# Altium footprint library Connectors THD.PcbLib: 631 footprints (part 6 of 46) (continued)
## 3M_N3627-6202RB [mm] "3M, 3000 Series, 24 Contacts - Pitch 2.54mm - Straight Four-Wall Header (Black) With Short Roll Pin Latch/Ejectors"
height 24.6
pads (26):
  round 1.6 hole 0.9: 1(-13.97,-1.27) 2(-13.97,1.27) 3(-11.43,-1.27) 4(-11.43,1.27) 5(-8.89,-1.27) 6(-8.89,1.27) 7(-6.35,-1.27) 8(-6.35,1.27) 9(-3.81,-1.27) 10(-3.81,1.27) 11(-1.27,-1.27) 12(-1.27,1.27) 13(1.27,-1.27) 14(1.27,1.27) 15(3.81,-1.27) 16(3.81,1.27) 17(6.35,-1.27) 18(6.35,1.27) 19(8.89,-1.27) 20(8.89,1.27) 21(11.43,-1.27) 22(11.43,1.27) 23(13.97,-1.27) 24(13.97,1.27)
  round 4.6 hole 2.8: MTG1(-22.924,-0.254) MTG2(22.924,-0.254)
Top Overlay:
  lines w0.2: -24.892,-2 -24.892,-4.318 ; -24.892,1.7 -24.892,4.3 ; -2.032,-4.318 -2.032,-3.175 ; 2.032,-4.318 2.032,-3.175 ; 14.732,-4.318 -24.892,-4.318 ; 14.732,4.318 -24.892,4.318 24.892,4.318 ; 24.892,-2 24.892,-4.318 -24.892,-4.318 ; 24.892,1.7 24.892,4.3 ; -17.907,-3.175 17.907,-3.175 17.907,3.175 -17.907,3.175 -17.907,-3.175 ; -15.24,-3.175 -12.7,-3.175 -13.97,-4.318 -15.24,-3.175
  text "1" at -16.307,-2.921 h1.02
  text "24" at 15.205,1.727 h1.02
Mechanical 8:
  lines w0.1: -14.97,-1.27 -13.97,-1.27 ; -14.97,1.27 -13.97,1.27 ; -13.97,-2.27 -13.97,-1.27 ; -13.97,-0.27 -13.97,-1.27 ; -13.97,0.27 -13.97,1.27 ; -13.97,2.27 -13.97,1.27 ; -12.97,-1.27 -13.97,-1.27 ; -12.97,1.27 -13.97,1.27 ; -12.43,-1.27 -11.43,-1.27 ; -12.43,1.27 -11.43,1.27 ; -11.43,-2.27 -11.43,-1.27 ; -11.43,-0.27 -11.43,-1.27 ; -11.43,0.27 -11.43,1.27 ; -11.43,2.27 -11.43,1.27 ; -10.43,-1.27 -11.43,-1.27 ; -10.43,1.27 -11.43,1.27 ; -9.89,-1.27 -8.89,-1.27 ; -9.89,1.27 -8.89,1.27 ; -8.89,-2.27 -8.89,-1.27 ; -8.89,-0.27 -8.89,-1.27 ; -8.89,0.27 -8.89,1.27 ; -8.89,2.27 -8.89,1.27 ; -7.89,-1.27 -8.89,-1.27 ; -7.89,1.27 -8.89,1.27 ; -7.35,-1.27 -6.35,-1.27 ; -7.35,1.27 -6.35,1.27 ; -6.35,-2.27 -6.35,-1.27 ; -6.35,-0.27 -6.35,-1.27 ; -6.35,0.27 -6.35,1.27 ; -6.35,2.27 -6.35,1.27 ; -5.35,-1.27 -6.35,-1.27 ; -5.35,1.27 -6.35,1.27 ; -4.81,-1.27 -3.81,-1.27 ; -4.81,1.27 -3.81,1.27 ; -3.81,-2.27 -3.81,-1.27 ; -3.81,-0.27 -3.81,-1.27 ; -3.81,0.27 -3.81,1.27 ; -3.81,2.27 -3.81,1.27 ; -2.81,-1.27 -3.81,-1.27 ; -2.81,1.27 -3.81,1.27 ; -2.27,-1.27 -1.27,-1.27 ; -2.27,1.27 -1.27,1.27 ; -1.27,-2.27 -1.27,-1.27 ; -1.27,-0.27 -1.27,-1.27 ; -1.27,0.27 -1.27,1.27 ; -1.27,2.27 -1.27,1.27 ; -1,0 0,0 ; -0.27,-1.27 -1.27,-1.27 ; -0.27,1.27 -1.27,1.27 ; 0,-1 0,0 ; 0,1 0,0 ; 0.27,-1.27 1.27,-1.27 ; 0.27,1.27 1.27,1.27 ; 1,0 0,0 ; 1.27,-2.27 1.27,-1.27 ; 1.27,-0.27 1.27,-1.27 ; 1.27,0.27 1.27,1.27 ; 1.27,2.27 1.27,1.27 ; 2.27,-1.27 1.27,-1.27 ; 2.27,1.27 1.27,1.27 ; 2.81,-1.27 3.81,-1.27 ; 2.81,1.27 3.81,1.27 ; 3.81,-2.27 3.81,-1.27 ; 3.81,-0.27 3.81,-1.27 ; 3.81,0.27 3.81,1.27 ; 3.81,2.27 3.81,1.27 ; 4.81,-1.27 3.81,-1.27 ; 4.81,1.27 3.81,1.27 ; 5.35,-1.27 6.35,-1.27 ; 5.35,1.27 6.35,1.27 ; 6.35,-2.27 6.35,-1.27 ; 6.35,-0.27 6.35,-1.27 ; 6.35,0.27 6.35,1.27 ; 6.35,2.27 6.35,1.27 ; 7.35,-1.27 6.35,-1.27 ; 7.35,1.27 6.35,1.27 ; 7.89,-1.27 8.89,-1.27 ; 7.89,1.265 8.89,1.265 ; 8.89,-2.27 8.89,-1.27 ; 8.89,-0.27 8.89,-1.27 ; 8.89,0.27 8.89,1.27 ; 8.89,2.27 8.89,1.27 ; 9.89,-1.27 8.89,-1.27 ; 9.89,1.27 8.89,1.27 ; 10.43,-1.27 11.43,-1.27 ; 10.43,1.27 11.43,1.27 ; 11.43,-2.27 11.43,-1.27 ; 11.43,-0.27 11.43,-1.27 ; 11.43,0.27 11.43,1.27 ; 11.43,2.27 11.43,1.27 ; 12.43,-1.27 11.43,-1.27 ; 12.43,1.27 11.43,1.27 ; 12.97,-1.27 13.97,-1.27 ; 12.97,1.265 13.97,1.265 ; 13.97,-2.27 13.97,-1.27 ; 13.97,-0.27 13.97,-1.27 ; 13.97,0.27 13.97,1.27 ; 13.97,2.27 13.97,1.27 ; 14.97,-1.27 13.97,-1.27 ; 14.97,1.27 13.97,1.27
Mechanical 14:
  circle w0.1: c22.924,-0.254 r1.27
  circle w0.1: c-22.924,-0.254 r1.27
  lines w0.1: -24.892,-3.175 -21.564,-3.175 ; -23.924,-0.254 -22.924,-0.254 ; -22.924,-1.254 -22.924,-0.254 ; -22.924,0.746 -22.924,-0.254 ; -21.924,-0.254 -22.924,-0.254 ; -21.564,-4.318 -21.564,-1.727 -14.605,-1.727 -14.605,1.27 -21.564,1.27 -21.564,4.318 ; -20.722,-4.318 -20.722,-1.727 ; -20.722,1.27 -20.722,4.318 ; -18.289,-4.318 -18.288,-1.727 ; -17.907,-1.727 -17.907,-3.175 17.907,-3.175 17.907,-1.727 ; -17.907,1.27 -17.907,3.175 17.907,3.175 17.907,1.27 ; -11.119,-4.318 -11.119,-3.175 ; -9.201,-4.318 -9.201,-3.175 ; 17.446,-4.318 17.446,-3.175 ; 17.446,3.175 17.446,4.318 ; 18.288,1.27 18.288,4.318 ; 18.329,-4.318 18.329,-1.727 ; 20.722,-4.318 20.722,-1.727 ; 20.722,1.27 20.722,4.318 ; 21.564,-4.318 21.564,-1.727 14.605,-1.727 14.605,1.27 21.564,1.27 21.564,4.318 ; 21.564,-3.175 24.892,-3.175 ; 21.564,3.175 24.892,3.175 ; 21.924,-0.254 22.924,-0.254 ; 22.924,-1.254 22.924,-0.254 ; 22.924,0.746 22.924,-0.254 ; 23.924,-0.254 22.924,-0.254 ; -24.892,-4.318 -24.892,4.318 24.892,4.318 24.892,-4.318 -24.892,-4.318 ; -24.892,3.175 -21.564,3.175 -24.892,3.175 ; -24.448,-1.134 -22.924,-2.014 -21.4,-1.134 -21.4,0.626 -22.924,1.506 -24.448,0.626 -24.448,-1.134 ; -18.288,1.27 -18.288,4.318 -18.288,1.27 ; -17.446,-4.318 -17.446,-3.175 -17.446,-4.318 ; -17.446,3.175 -17.446,4.318 -17.446,3.175 ; -15.24,-3.175 -12.7,-3.175 -13.97,-4.318 -15.24,-3.175 ; 21.4,-1.134 22.924,-2.014 24.448,-1.134 24.448,0.626 22.924,1.506 21.4,0.626 21.4,-1.134
  text "1" at -16.307,-2.921 h1.02
  text "24" at 15.205,1.727 h1.02
3D body: height 24.64, standoff -3.94, extent -24.892,-4.318 24.892,4.318

## 3M_N3764-6002RB [mm] "3M, 3000 Series, 64 Contacts - Pitch 2.54mm - Straight Four-Wall Header (Black) Without Latch/Ejectors"
height 17.3
pads (66):
  round 1.6 hole 0.9: 1(-39.37,-1.27) 2(-39.37,1.27) 3(-36.83,-1.27) 4(-36.83,1.27) 5(-34.29,-1.27) 6(-34.29,1.27) 7(-31.75,-1.27) 8(-31.75,1.27) 9(-29.21,-1.27) 10(-29.21,1.27) 11(-26.67,-1.27) 12(-26.67,1.27) 13(-24.13,-1.27) 14(-24.13,1.27) 15(-21.59,-1.27) 16(-21.59,1.27) 17(-19.05,-1.27) 18(-19.05,1.27) 19(-16.51,-1.27) 20(-16.51,1.27) 21(-13.97,-1.27) 22(-13.97,1.27) 23(-11.43,-1.27) 24(-11.43,1.27) 25(-8.89,-1.27) 26(-8.89,1.27) 27(-6.35,-1.27) 28(-6.35,1.27) 29(-3.81,-1.27) 30(-3.81,1.27) 31(-1.27,-1.27) 32(-1.27,1.27) 33(1.27,-1.27) 34(1.27,1.27) 35(3.81,-1.27) 36(3.81,1.27) 37(6.35,-1.27) 38(6.35,1.27) 39(8.89,-1.27) 40(8.89,1.27) 41(11.43,-1.27) 42(11.43,1.27) 43(13.97,-1.27) 44(13.97,1.27) 45(16.51,-1.27) 46(16.51,1.27) 47(19.05,-1.27) 48(19.05,1.27) 49(21.59,-1.27) 50(21.59,1.27) 51(24.13,-1.27) 52(24.13,1.27) 53(26.67,-1.27) 54(26.67,1.27) 55(29.21,-1.27) 56(29.21,1.27) 57(31.75,-1.27) 58(31.75,1.27) 59(34.29,-1.27) 60(34.29,1.27) 61(36.83,-1.27) 62(36.83,1.27) 63(39.37,-1.27) 64(39.37,1.27)
  round 4.6 hole 2.6: MTG1(-48.31,-0.254) MTG2(48.31,-0.254)
Top Overlay:
  lines w0.2: -50.292,-2 -50.292,-4.318 50.292,-4.318 50.292,-2 ; -50.292,1.7 -50.292,4.3 50.292,4.3 50.292,1.7 ; -43.307,-3.175 43.307,-3.175 43.307,3.175 -43.307,3.175 -43.307,-3.175 ; -40.64,-3.175 -39.37,-4.318 -38.1,-3.175 -40.64,-3.175
  text "1" at -41.707,-2.921 h1.02
  text "64" at 40.605,1.727 h1.02
Mechanical 8:
  drawing of 276 lines, arcs and shapes, not listed
Mechanical 14:
  circle w0.1: c-48.324,-0.254 r1.27
  circle w0.1: c48.324,-0.254 r1.27
  lines w0.1: -50.292,-3.175 -46.964,-3.175 ; -49.324,-0.254 -48.324,-0.254 ; -48.324,-1.254 -48.324,-0.254 ; -48.324,0.746 -48.324,-0.254 ; -47.324,-0.254 -48.324,-0.254 ; -46.964,-4.318 -46.964,-1.727 ; -46.964,1.27 -46.964,4.318 ; -46.122,-4.318 -46.122,-1.727 ; -46.122,1.27 -46.122,4.318 ; -43.689,-4.318 -43.688,-1.727 ; -43.307,-1.727 -43.307,-3.175 ; -43.307,1.27 -43.307,3.175 ; -36.519,-4.318 -36.519,-3.175 ; -34.601,-4.318 -34.601,-3.175 ; -3.302,-4.318 -3.302,-3.175 ; 0.762,-4.318 0.762,-3.175 ; 37.141,-4.318 37.141,-3.175 ; 39.059,-4.318 39.059,-3.175 ; 42.846,-4.318 42.846,-3.175 ; 42.846,3.175 42.846,4.318 ; 43.307,-1.727 43.307,-3.175 ; 43.307,1.27 43.307,3.175 ; 43.688,1.27 43.688,4.318 ; 43.729,-4.318 43.729,-1.727 ; 46.122,-4.318 46.122,-1.727 ; 46.122,1.27 46.122,4.318 ; 46.964,-4.318 46.964,-1.727 40.005,-1.727 40.005,1.27 46.964,1.27 46.964,4.318 ; 46.964,-3.175 50.292,-3.175 ; 46.964,3.175 50.292,3.175 ; 47.324,-0.254 48.324,-0.254 ; 48.324,-1.254 48.324,-0.254 ; 48.324,0.746 48.324,-0.254 ; 49.324,-0.254 48.324,-0.254 ; -50.292,-4.318 -50.292,4.318 ; -50.292,-4.318 -50.292,4.318 ; -50.292,-4.318 -50.292,4.318 ; -50.292,-4.318 50.292,-4.318 ; -50.292,4.318 50.292,4.318 ; -43.307,-3.175 -43.307,3.175 ; -43.307,-3.175 -43.307,3.175 ; -43.307,-3.175 43.307,-3.175 ; -43.307,3.175 43.307,3.175 ; 43.307,-3.175 43.307,3.175 ; 43.307,-3.175 43.307,3.175 ; 50.292,-4.318 50.292,4.318 ; 50.292,-4.318 50.292,4.318 ; -50.292,3.175 -46.964,3.175 -50.292,3.175 ; -49.848,-1.134 -49.848,0.626 -48.324,1.506 -46.8,0.626 -46.8,-1.134 -48.324,-2.014 -49.848,-1.134 ; -43.688,1.27 -43.688,4.318 -43.688,1.27 ; -42.846,-4.318 -42.846,-3.175 -42.846,-4.318 ; -42.846,3.175 -42.846,4.318 -42.846,3.175 ; 46.8,-1.134 46.8,0.626 48.324,1.506 49.848,0.626 49.848,-1.134 48.324,-2.014 46.8,-1.134
  text "1" at -41.707,-2.921 h1.02
  text "64" at 40.605,1.727 h1.02
3D body: height 17.27, standoff -3.94, extent -50.292,-4.318 50.292,4.318

## 3M_N3764-6202RB [mm] "3M, 3000 Series, 64 Contacts - Pitch 2.54mm - Straight Four-Wall Header (Black) With Short Roll Pin Latch/Ejectors"
height 24.6
pads (66):
  round 1.6 hole 0.9: 1(-39.37,-1.27) 2(-39.37,1.27) 3(-36.83,-1.27) 4(-36.83,1.27) 5(-34.29,-1.27) 6(-34.29,1.27) 7(-31.75,-1.27) 8(-31.75,1.27) 9(-29.21,-1.27) 10(-29.21,1.27) 11(-26.67,-1.27) 12(-26.67,1.27) 13(-24.13,-1.27) 14(-24.13,1.27) 15(-21.59,-1.27) 16(-21.59,1.27) 17(-19.05,-1.27) 18(-19.05,1.27) 19(-16.51,-1.27) 20(-16.51,1.27) 21(-13.97,-1.27) 22(-13.97,1.27) 23(-11.43,-1.27) 24(-11.43,1.27) 25(-8.89,-1.27) 26(-8.89,1.27) 27(-6.35,-1.27) 28(-6.35,1.27) 29(-3.81,-1.27) 30(-3.81,1.27) 31(-1.27,-1.27) 32(-1.27,1.27) 33(1.27,-1.27) 34(1.27,1.27) 35(3.81,-1.27) 36(3.81,1.27) 37(6.35,-1.27) 38(6.35,1.27) 39(8.89,-1.27) 40(8.89,1.27) 41(11.43,-1.27) 42(11.43,1.27) 43(13.97,-1.27) 44(13.97,1.27) 45(16.51,-1.27) 46(16.51,1.27) 47(19.05,-1.27) 48(19.05,1.27) 49(21.59,-1.27) 50(21.59,1.27) 51(24.13,-1.27) 52(24.13,1.27) 53(26.67,-1.27) 54(26.67,1.27) 55(29.21,-1.27) 56(29.21,1.27) 57(31.75,-1.27) 58(31.75,1.27) 59(34.29,-1.27) 60(34.29,1.27) 61(36.83,-1.27) 62(36.83,1.27) 63(39.37,-1.27) 64(39.37,1.27)
  round 4.6 hole 2.6: MTG1(-48.31,-0.254) MTG2(48.31,-0.254)
Top Overlay:
  lines w0.2: -50.292,-2 -50.292,-4.318 50.292,-4.318 50.292,-2 ; -50.292,1.7 -50.292,4.3 50.292,4.3 50.292,1.7 ; -43.307,-3.175 43.307,-3.175 43.307,3.175 -43.307,3.175 -43.307,-3.175 ; -40.64,-3.175 -39.37,-4.318 -38.1,-3.175 -40.64,-3.175
  text "1" at -41.707,-2.921 h1.02
  text "64" at 40.605,1.727 h1.02
Mechanical 8:
  drawing of 276 lines, arcs and shapes, not listed
Mechanical 14:
  circle w0.1: c-48.324,-0.254 r1.27
  circle w0.1: c48.324,-0.254 r1.27
  lines w0.1: -50.292,-3.175 -46.964,-3.175 ; -49.324,-0.254 -48.324,-0.254 ; -48.324,-1.254 -48.324,-0.254 ; -48.324,0.746 -48.324,-0.254 ; -47.324,-0.254 -48.324,-0.254 ; -46.964,-4.318 -46.964,-1.727 ; -46.964,1.27 -46.964,4.318 ; -46.122,-4.318 -46.122,-1.727 ; -46.122,1.27 -46.122,4.318 ; -43.689,-4.318 -43.688,-1.727 ; -43.307,-1.727 -43.307,-3.175 ; -43.307,1.27 -43.307,3.175 ; -36.519,-4.318 -36.519,-3.175 ; -34.601,-4.318 -34.601,-3.175 ; -3.302,-4.318 -3.302,-3.175 ; 0.762,-4.318 0.762,-3.175 ; 37.141,-4.318 37.141,-3.175 ; 39.059,-4.318 39.059,-3.175 ; 42.846,-4.318 42.846,-3.175 ; 42.846,3.175 42.846,4.318 ; 43.307,-1.727 43.307,-3.175 ; 43.307,1.27 43.307,3.175 ; 43.688,1.27 43.688,4.318 ; 43.729,-4.318 43.729,-1.727 ; 46.122,-4.318 46.122,-1.727 ; 46.122,1.27 46.122,4.318 ; 46.964,-4.318 46.964,-1.727 40.005,-1.727 40.005,1.27 46.964,1.27 46.964,4.318 ; 46.964,-3.175 50.292,-3.175 ; 46.964,3.175 50.292,3.175 ; 47.324,-0.254 48.324,-0.254 ; 48.324,-1.254 48.324,-0.254 ; 48.324,0.746 48.324,-0.254 ; 49.324,-0.254 48.324,-0.254 ; -50.292,-4.318 -50.292,4.318 ; -50.292,-4.318 -50.292,4.318 ; -50.292,-4.318 -50.292,4.318 ; -50.292,-4.318 50.292,-4.318 ; -50.292,4.318 50.292,4.318 ; -43.307,-3.175 -43.307,3.175 ; -43.307,-3.175 -43.307,3.175 ; -43.307,-3.175 43.307,-3.175 ; -43.307,3.175 43.307,3.175 ; 43.307,-3.175 43.307,3.175 ; 43.307,-3.175 43.307,3.175 ; 50.292,-4.318 50.292,4.318 ; 50.292,-4.318 50.292,4.318 ; -50.292,3.175 -46.964,3.175 -50.292,3.175 ; -49.848,-1.134 -49.848,0.626 -48.324,1.506 -46.8,0.626 -46.8,-1.134 -48.324,-2.014 -49.848,-1.134 ; -43.688,1.27 -43.688,4.318 -43.688,1.27 ; -42.846,-4.318 -42.846,-3.175 -42.846,-4.318 ; -42.846,3.175 -42.846,4.318 -42.846,3.175 ; 46.8,-1.134 46.8,0.626 48.324,1.506 49.848,0.626 49.848,-1.134 48.324,-2.014 46.8,-1.134
  text "1" at -41.707,-2.921 h1.02
  text "64" at 40.605,1.727 h1.02
3D body: height 17.98, standoff -3.94, extent -59.689,-4.318 59.689,4.318

## 3M_N3793-5202RB [mm] "3M, 3000 Series, 10 Contacts - Pitch 2.54mm - Right Angle Four-Wall Header (Black) With Short Roll Pin Latch/Ejectors"
height 8.6
pads (12):
  round 1.6 hole 0.9: 1(-5.08,-1.27) 2(-5.08,1.27) 3(-2.54,-1.27) 4(-2.54,1.27) 5(0,-1.27) 6(0,1.27) 7(2.54,-1.27) 8(2.54,1.27) 9(5.08,-1.27) 10(5.08,1.27)
  round 4.6 hole 2.8: MTG1(-10.986,0.533) MTG2(10.992,0.533)
Top Overlay:
  circle w0.2: c-10.668,6.375 r0.787
  circle w0.2: c10.668,6.375 r0.787
  circle w0.2: c-5.153,-3.048 r0.15
  lines w0.2: -12.89,-2.007 -16.002,-2.007 -16.002,5.105 -12.674,14.249 -11.832,14.249 ccw(c-10.668,14.757) -9.398,14.757 -8.556,14.757 -8.114,12.251 ccw(c-6.863,12.471) -6.863,11.201 6.863,11.201 ccw(c6.863,12.471) 8.114,12.251 8.556,14.757 9.398,14.757 ccw(c10.668,14.757) 11.832,14.249 12.674,14.249 16.002,5.105 16.002,-2.007 12.89,-2.007 ; -11.989,14.249 -11.989,22.024 -11.836,22.112 -6.731,19.164 -6.731,15.799 -6.833,15.697 -11.989,15.697 ; -8.763,14.757 -8.763,20.337 ; -6.344,11.201 -5.074,9.002 -4.537,9.931 ; -4.769,11.201 -4.769,9.931 -2.851,9.931 -2.858,11.201 ; -2.032,5.105 2.032,5.105 ; -2.032,11.201 -2.032,3.581 2.032,3.581 2.032,11.201 ; -0.318,5.105 -0.318,11.201 ; 0.318,5.105 0.318,11.201 ; 8.763,14.757 8.763,15.697 ; 11.989,14.249 11.989,22.024 ccw(c11.887,22.024) 11.836,22.112 6.731,19.164 6.731,15.799 ccw(c6.833,15.799) 6.833,15.697 11.989,15.697
  text "10" at 6.34,0.889 h1.02
  text "1" at -7.112,-1.7 h1.02
Mechanical 8:
  lines w0.1: -11.986,0.533 -10.986,0.533 ; -10.986,-0.467 -10.986,0.533 ; -10.986,1.533 -10.986,0.533 ; -9.986,0.533 -10.986,0.533 ; -6.08,-1.27 -5.08,-1.27 ; -6.08,1.27 -5.08,1.27 ; -5.08,-2.27 -5.08,-1.27 ; -5.08,-0.27 -5.08,-1.27 ; -5.08,0.27 -5.08,1.27 ; -5.08,2.27 -5.08,1.27 ; -4.08,-1.27 -5.08,-1.27 ; -4.08,1.27 -5.08,1.27 ; -3.54,-1.27 -2.54,-1.27 ; -3.54,1.27 -2.54,1.27 ; -2.54,-2.27 -2.54,-1.27 ; -2.54,-0.27 -2.54,-1.27 ; -2.54,0.27 -2.54,1.27 ; -2.54,2.27 -2.54,1.27 ; -1.54,-1.27 -2.54,-1.27 ; -1.54,1.27 -2.54,1.27 ; -1,-1.27 0,-1.27 ; -1,0 0,0 ; -1,1.27 0,1.27 ; 0,-2.27 0,-1.27 ; 0,-1 0,0 ; 0,-0.27 0,-1.27 ; 0,0.27 0,1.27 ; 0,1 0,0 ; 0,2.27 0,1.27 ; 1,-1.27 0,-1.27 ; 1,0 0,0 ; 1,1.27 0,1.27 ; 1.54,-1.27 2.54,-1.27 ; 1.54,1.27 2.54,1.27 ; 2.54,-2.27 2.54,-1.27 ; 2.54,-0.27 2.54,-1.27 ; 2.54,0.27 2.54,1.27 ; 2.54,2.27 2.54,1.27 ; 3.54,-1.27 2.54,-1.27 ; 3.54,1.27 2.54,1.27 ; 4.08,-1.27 5.08,-1.27 ; 4.08,1.27 5.08,1.27 ; 5.08,-2.27 5.08,-1.27 ; 5.08,-0.27 5.08,-1.27 ; 5.08,0.27 5.08,1.27 ; 5.08,2.27 5.08,1.27 ; 6.08,-1.27 5.08,-1.27 ; 6.08,1.27 5.08,1.27 ; 9.992,0.533 10.992,0.533 ; 10.992,-0.467 10.992,0.533 ; 10.992,1.533 10.992,0.533 ; 11.992,0.533 10.992,0.533
Mechanical 14:
  circle w0.1: c-10.986,0.533 r1.27
  circle w0.1: c-10.668,6.375 r0.787
  circle w0.1: c10.986,0.533 r1.27
  circle w0.1: c10.668,6.375 r0.787
  lines w0.1: -13.487,-2.007 -13.487,1.978 -10.986,3.422 -8.484,1.978 -8.484,-2.007 ; -11.989,14.249 -11.989,22.024 -11.836,22.112 -6.731,19.164 -6.731,15.799 -6.833,15.697 -11.989,15.697 ; -8.763,14.757 -8.763,20.337 ; -6.344,11.201 -5.074,9.002 -4.537,9.931 ; -4.769,11.201 -4.769,9.931 -2.851,9.931 -2.858,11.201 ; -2.032,5.105 2.032,5.105 ; -2.032,11.201 -2.032,3.581 2.032,3.581 2.032,11.201 ; -0.318,5.105 -0.318,11.201 ; 0.318,5.105 0.318,11.201 ; 8.484,-2.007 8.484,1.978 10.986,3.422 13.487,1.978 13.487,-2.007 ; 8.763,14.757 8.763,15.697 ; 11.989,14.249 11.989,22.024 ccw(c11.887,22.024) 11.836,22.112 6.731,19.164 6.731,15.799 ccw(c6.833,15.799) 6.833,15.697 11.989,15.697 ; -16.002,-2.007 -16.002,5.105 -12.674,14.249 -11.832,14.249 ccw(c-10.668,14.757) -9.398,14.757 -8.556,14.757 -8.114,12.251 ccw(c-6.863,12.471) -6.863,11.201 6.863,11.201 ccw(c6.863,12.471) 8.114,12.251 8.556,14.757 9.398,14.757 ccw(c10.668,14.757) 11.832,14.249 12.674,14.249 16.002,5.105 16.002,-2.007 -16.002,-2.007
  text "10" at 6.34,0.889 h1.02
  text "1" at -7.112,-1.7 h1.02
3D body: height 8.64, standoff -3.94, extent -16.002,-2.021 16.002,22.125

## 3M_N3793-5302RB [mm] "3M, 3000 Series, 10 Contacts - Pitch 2.54mm - Right Angle Four-Wall Header (Black) With Long Roll Pin Latch/Ejectors"
height 8.6
pads (12):
  round 1.6 hole 0.9: 1(-5.08,-1.27) 2(-5.08,1.27) 3(-2.54,-1.27) 4(-2.54,1.27) 5(0,-1.27) 6(0,1.27) 7(2.54,-1.27) 8(2.54,1.27) 9(5.08,-1.27) 10(5.08,1.27)
  round 4.6 hole 2.8: MTG1(-10.986,0.533) MTG2(10.992,0.533)
Top Overlay:
  circle w0.2: c-5.153,-3.048 r0.15
  circle w0.2: c10.668,6.375 r0.787
  circle w0.2: c-10.668,6.375 r0.787
  lines w0.2: -12.89,-2.007 -16.002,-2.007 -16.002,5.105 -12.674,14.249 -11.832,14.249 ccw(c-10.668,14.757) -9.398,14.757 -8.556,14.757 -8.114,12.251 ccw(c-6.863,12.471) -6.863,11.201 6.863,11.201 ccw(c6.863,12.471) 8.114,12.251 8.556,14.757 9.398,14.757 ccw(c10.668,14.757) 11.832,14.249 12.674,14.249 16.002,5.105 16.002,-2.007 12.89,-2.007 ; -11.989,14.249 -11.989,24.561 -11.836,24.649 -6.731,21.702 -6.731,18.336 -6.833,18.235 -11.989,18.235 ; -8.763,14.757 -8.763,22.875 ; -6.344,11.201 -5.074,9.002 -4.537,9.931 ; -4.769,11.201 -4.769,9.931 -2.851,9.931 -2.858,11.201 ; -2.032,5.105 2.032,5.105 ; -2.032,11.201 -2.032,3.581 2.032,3.581 2.032,11.201 ; -0.318,5.105 -0.318,11.201 ; 0.318,5.105 0.318,11.201 ; 8.763,22.875 8.787,14.757 ; 11.989,14.249 11.989,24.561 11.836,24.649 6.731,21.702 6.731,18.336 6.833,18.235 11.989,18.235
  text "1" at -7.112,-1.7 h1.02
  text "10" at 6.34,0.889 h1.02
Mechanical 8:
  lines w0.1: -11.986,0.533 -10.986,0.533 ; -10.986,-0.467 -10.986,0.533 ; -10.986,1.533 -10.986,0.533 ; -9.986,0.533 -10.986,0.533 ; -6.08,-1.27 -5.08,-1.27 ; -6.08,1.27 -5.08,1.27 ; -5.08,-2.27 -5.08,-1.27 ; -5.08,-0.27 -5.08,-1.27 ; -5.08,0.27 -5.08,1.27 ; -5.08,2.27 -5.08,1.27 ; -4.08,-1.27 -5.08,-1.27 ; -4.08,1.27 -5.08,1.27 ; -3.54,-1.27 -2.54,-1.27 ; -3.54,1.27 -2.54,1.27 ; -2.54,-2.27 -2.54,-1.27 ; -2.54,-0.27 -2.54,-1.27 ; -2.54,0.27 -2.54,1.27 ; -2.54,2.27 -2.54,1.27 ; -1.54,-1.27 -2.54,-1.27 ; -1.54,1.27 -2.54,1.27 ; -1,-1.27 0,-1.27 ; -1,0 0,0 ; -1,1.27 0,1.27 ; 0,-2.27 0,-1.27 ; 0,-1 0,0 ; 0,-0.27 0,-1.27 ; 0,0.27 0,1.27 ; 0,1 0,0 ; 0,2.27 0,1.27 ; 1,-1.27 0,-1.27 ; 1,0 0,0 ; 1,1.27 0,1.27 ; 1.54,-1.27 2.54,-1.27 ; 1.54,1.27 2.54,1.27 ; 2.54,-2.27 2.54,-1.27 ; 2.54,-0.27 2.54,-1.27 ; 2.54,0.27 2.54,1.27 ; 2.54,2.27 2.54,1.27 ; 3.54,-1.27 2.54,-1.27 ; 3.54,1.27 2.54,1.27 ; 4.08,-1.27 5.08,-1.27 ; 4.08,1.27 5.08,1.27 ; 5.08,-2.27 5.08,-1.27 ; 5.08,-0.27 5.08,-1.27 ; 5.08,0.27 5.08,1.27 ; 5.08,2.27 5.08,1.27 ; 6.08,-1.27 5.08,-1.27 ; 6.08,1.27 5.08,1.27 ; 9.992,0.533 10.992,0.533 ; 10.992,-0.467 10.992,0.533 ; 10.992,1.533 10.992,0.533 ; 11.992,0.533 10.992,0.533
Mechanical 14:
  circle w0.1: c10.668,6.375 r0.787
  circle w0.1: c10.986,0.533 r1.27
  circle w0.1: c-10.668,6.375 r0.787
  circle w0.1: c-10.986,0.533 r1.27
  lines w0.1: -13.487,-2.007 -13.487,1.978 -10.986,3.422 -8.484,1.978 -8.484,-2.007 ; -11.989,14.249 -11.989,24.561 -11.836,24.649 -6.731,21.702 -6.731,18.336 -6.833,18.235 -11.989,18.235 ; -8.763,14.757 -8.763,22.875 ; -6.344,11.201 -5.074,9.002 -4.537,9.931 ; -4.769,11.201 -4.769,9.931 -2.851,9.931 -2.858,11.201 ; -2.032,5.105 2.032,5.105 ; -2.032,11.201 -2.032,3.581 2.032,3.581 2.032,11.201 ; -0.318,5.105 -0.318,11.201 ; 0.318,5.105 0.318,11.201 ; 8.484,-2.007 8.484,1.978 10.986,3.422 13.487,1.978 13.487,-2.007 ; 8.763,22.875 8.787,14.757 ; 11.989,14.249 11.989,24.561 11.836,24.649 6.731,21.702 6.731,18.336 6.833,18.235 11.989,18.235 ; -16.002,-2.007 16.002,-2.007 16.002,5.105 12.674,14.249 11.832,14.249 cw(c10.668,14.757) 9.398,14.757 8.556,14.757 8.114,12.251 cw(c6.863,12.471) 6.863,11.201 -6.863,11.201 cw(c-6.863,12.471) -8.114,12.251 -8.556,14.757 -9.398,14.757 cw(c-10.668,14.757) -11.832,14.249 -12.674,14.249 -16.002,5.105 -16.002,-2.007
  text "1" at -7.112,-1.7 h1.02
  text "10" at 6.34,0.889 h1.02
3D body: height 8.64, standoff -3.94, extent -16.002,-2.021 16.002,24.663

## 3M_N3793-6202RB [mm] "3M, 3000 Series, 10 Contacts - Pitch 2.54mm - Straight Four-Wall Header (Black) With Short Roll Pin Latch/Ejectors"
height 24.6
pads (12):
  round 1.6 hole 0.9: 1(-5.08,-1.27) 2(-5.08,1.27) 3(-2.54,-1.27) 4(-2.54,1.27) 5(0,-1.27) 6(0,1.27) 7(2.54,-1.27) 8(2.54,1.27) 9(5.08,-1.27) 10(5.08,1.27)
  round 4.6 hole 2.8: MTG1(-14.034,-0.256) MTG2(14.034,-0.252)
Top Overlay:
  lines w0.2: -15.998,-2.109 -15.998,-4.318 15.998,-4.318 15.998,-2.104 ; -15.998,1.596 -15.998,4.318 15.998,4.318 15.998,1.601 ; -6.35,-3.175 -5.08,-4.318 -3.81,-3.175 ; -2.03,-4.318 -2.03,-3.174 ; 2.032,-4.318 2.032,-3.174 ; 2.851,-4.318 2.851,-3.174 ; 4.767,-4.318 4.767,-3.174 ; -9.015,-3.174 -9.015,3.176 9.015,3.176 9.015,-3.174 -9.015,-3.174
  text "1" at -7.417,-2.921 h1.02
Mechanical 8:
  lines w0.1: -14.534,-0.256 -14.034,-0.256 ; -14.034,-0.756 -14.034,-0.256 ; -14.034,0.244 -14.034,-0.256 ; -13.534,-0.256 -14.034,-0.256 ; -5.58,-1.27 -5.08,-1.27 ; -5.58,1.27 -5.08,1.27 ; -5.08,-1.77 -5.08,-1.27 ; -5.08,-0.77 -5.08,-1.27 ; -5.08,0.77 -5.08,1.27 ; -5.08,1.77 -5.08,1.27 ; -4.58,-1.27 -5.08,-1.27 ; -4.58,1.27 -5.08,1.27 ; -3.04,-1.27 -2.54,-1.27 ; -3.04,1.27 -2.54,1.27 ; -2.54,-1.77 -2.54,-1.27 ; -2.54,-0.77 -2.54,-1.27 ; -2.54,0.77 -2.54,1.27 ; -2.54,1.77 -2.54,1.27 ; -2.04,-1.27 -2.54,-1.27 ; -2.04,1.27 -2.54,1.27 ; -0.5,-1.27 0,-1.27 ; -0.5,0 0,0 ; -0.5,1.27 0,1.27 ; 0,-1.77 0,-1.27 ; 0,-0.77 0,-1.27 ; 0,-0.5 0,0 ; 0,0.5 0,0 ; 0,0.77 0,1.27 ; 0,1.77 0,1.27 ; 0.5,-1.27 0,-1.27 ; 0.5,0 0,0 ; 0.5,1.27 0,1.27 ; 2.04,-1.27 2.54,-1.27 ; 2.04,1.27 2.54,1.27 ; 2.54,-1.77 2.54,-1.27 ; 2.54,-0.77 2.54,-1.27 ; 2.54,0.77 2.54,1.27 ; 2.54,1.77 2.54,1.27 ; 3.04,-1.27 2.54,-1.27 ; 3.04,1.27 2.54,1.27 ; 4.58,-1.27 5.08,-1.27 ; 4.58,1.27 5.08,1.27 ; 5.08,-1.77 5.08,-1.27 ; 5.08,-0.77 5.08,-1.27 ; 5.08,0.77 5.08,1.27 ; 5.08,1.77 5.08,1.27 ; 5.58,-1.27 5.08,-1.27 ; 5.58,1.27 5.08,1.27 ; 13.534,-0.252 14.034,-0.252 ; 14.034,-0.752 14.034,-0.252 ; 14.034,0.248 14.034,-0.252 ; 14.534,-0.252 14.034,-0.252
Mechanical 14:
  lines w0.1: -15.998,-4.318 -15.998,4.318 ; -15.998,-4.318 15.998,-4.318 ; -15.998,-4.318 -15.998,4.318 ; -15.998,-4.318 15.998,-4.318 ; -15.998,4.318 15.998,4.318 ; -15.998,4.318 15.998,4.318 ; -15.553,-1.133 -15.553,0.628 ; -15.553,-1.133 -14.719,-1.615 -15.553,-1.133 ; -15.553,-1.133 -15.553,0.628 ; -15.553,0.628 -14.719,1.109 -15.553,0.628 ; -14.719,-1.727 -14.719,1.271 ; -14.719,-1.727 -11.985,-1.727 ; -14.719,-1.727 -14.719,1.271 ; -14.719,-1.727 -11.985,-1.727 ; -14.719,1.271 -11.985,1.271 ; -14.719,1.271 -11.985,1.271 ; -14.031,-2.014 -14.526,-1.727 -14.031,-2.014 ; -14.031,-2.014 -13.535,-1.727 -14.031,-2.014 ; -14.031,1.507 -13.622,1.271 -14.031,1.507 ; -14.031,1.507 -14.439,1.271 -14.031,1.507 ; -11.985,-2.819 -11.985,-1.727 ; -11.985,-2.819 -8.759,-2.819 ; -11.985,-2.819 -11.985,-1.727 ; -11.985,-2.819 -8.759,-2.819 ; -11.985,1.271 -11.985,2.362 ; -11.985,1.271 -11.985,2.362 ; -11.985,2.362 -8.763,2.362 -11.985,2.362 ; -9.015,-3.174 9.015,-3.174 ; -9.015,-3.174 -9.015,-2.819 -9.015,-3.174 ; -9.015,-3.174 9.015,-3.174 ; -9.015,3.176 9.015,3.176 ; -9.015,3.176 -9.015,2.362 -9.015,3.176 ; -9.015,3.176 9.015,3.176 ; -8.759,-2.819 -8.759,-1.727 ; -8.759,-2.819 -8.759,-1.727 ; -8.759,-1.727 -5.713,-1.727 ; -8.759,-1.727 -5.713,-1.727 ; -8.759,1.271 -8.759,2.362 -8.759,1.271 ; -8.759,1.271 -5.713,1.271 ; -8.759,1.271 -5.713,1.271 ; -5.713,-1.727 -5.713,1.271 ; -5.713,-1.727 -5.713,1.271 ; 5.713,-1.727 5.713,1.271 ; 5.713,-1.727 8.759,-1.727 ; 5.713,-1.727 5.713,1.271 ; 5.713,-1.727 8.759,-1.727 ; 5.713,1.271 8.759,1.271 ; 5.713,1.271 8.759,1.271 ; 8.759,-2.819 8.759,-1.727 ; 8.759,-2.819 11.985,-2.819 ; 8.759,-2.819 8.759,-1.727 ; 8.759,-2.819 11.985,-2.819 ; 8.759,1.271 8.759,2.362 ; 8.759,1.271 8.759,2.362 ; 8.759,2.362 11.985,2.362 ; 8.759,2.362 11.985,2.362 ; 9.015,-3.174 9.015,-2.819 9.015,-3.174 ; 9.015,3.176 9.015,2.362 9.015,3.176 ; 11.985,-2.819 11.985,-1.727 ; 11.985,-2.819 11.985,-1.727 ; 11.985,-1.727 14.719,-1.727 ; 11.985,-1.727 14.719,-1.727 ; 11.985,1.271 11.985,2.362 ; 11.985,1.271 14.719,1.271 ; 11.985,1.271 11.985,2.362 ; 11.985,1.271 14.719,1.271 ; 14.031,-2.014 14.526,-1.727 14.031,-2.014 ; 14.031,-2.014 13.535,-1.727 14.031,-2.014 ; 14.031,1.507 13.622,1.271 14.031,1.507 ; 14.031,1.507 14.439,1.271 14.031,1.507 ; 14.719,-1.727 14.719,1.271 ; 14.719,-1.727 14.719,1.271 ; 15.553,-1.133 15.553,0.628 ; 15.553,-1.133 14.719,-1.615 15.553,-1.133 ; 15.553,-1.133 15.553,0.628 ; 15.553,0.628 14.719,1.109 15.553,0.628 ; 15.998,-4.318 15.998,4.318 ; 15.998,-4.318 15.998,4.318 ; -15.998,-3.174 -12.67,-3.174 -15.998,-3.174 ; -15.998,3.176 -12.67,3.176 -15.998,3.176 ; -12.67,-4.318 -12.67,-1.727 -12.67,-4.318 ; -12.67,1.271 -12.67,4.318 -12.67,1.271 ; -11.831,-4.318 -11.831,-2.819 -11.831,-4.318 ; -11.831,2.362 -11.831,4.318 -11.831,2.362 ; -9.395,-4.318 -9.395,-2.819 -9.395,-4.318 ; -9.395,2.362 -9.395,4.318 -9.395,2.362 ; -8.553,-4.318 -8.553,-3.174 -8.553,-4.318 ; -8.553,3.176 -8.553,4.318 -8.553,3.176 ; -2.03,-4.318 -2.03,-3.174 -2.03,-4.318 ; 2.032,-4.318 2.032,-3.174 2.032,-4.318 ; 2.851,-4.318 2.851,-3.174 2.851,-4.318 ; 4.767,-4.318 4.767,-3.174 4.767,-4.318 ; 8.553,-4.318 8.553,-3.174 8.553,-4.318 ; 8.553,3.176 8.553,4.318 8.553,3.176 ; 9.395,-4.318 9.395,-2.819 9.395,-4.318 ; 9.395,2.362 9.395,4.318 9.395,2.362 ; 11.831,-4.318 11.831,-2.819 11.831,-4.318 ; 11.831,2.362 11.831,4.318 11.831,2.362 ; 12.67,-4.318 12.67,-1.727 12.67,-4.318 ; 12.67,-3.174 15.998,-3.174 12.67,-3.174 ; 12.67,1.271 12.67,4.318 12.67,1.271 ; 12.67,3.176 15.998,3.176 12.67,3.176
3D body: height 24.64, standoff -3.94, extent -16.002,-4.318 16.002,4.318